# Altium schematic symbol library jlcpcb_2025_04_capacitors_extended_0402.schlib: 3594 symbols (part 12 of 20) (continued)
## FN15X562K250PNG
designator C?  Capacitance: 5.6nF  (hidden comment: *)
Capacitor, Ceramic (MLCC), 5.6nF, ±10%, 25V, X7R, ±10%, SMD 0402; Manufacturer: PSA(Prosperity Dielectrics); Manufacturer Part Number: FN15X562K250PNG; Package Size: 0402; JLCPCB Basic Part: No; JLCPCB Part Number: C565560; Supplier 1: LCSC; Category: Capacitors - MLCC; Supplier Part Number 1: C565560; Tolerance: ±10%; Voltage Rating: 25V; Temperature Coefficient: X7R; RoHS: Yes; ComponentLink1Description: Datasheet; ComponentLink2Description: JLCPCB Part URL; ComponentLink2URL: https://jlcpcb.com/partdetail/C565560; ComponentLink3Description: LCSC Part URL; ComponentLink3URL: https://lcsc.com/product-detail/Multilayer-Ceramic-Capacitors-MLCC---SMD-SMT_PSAProsperity-Dielectrics-PSAProsperity-Dielectrics-FN15X562K250PNG_C565560.html
footprint CAP-0402 (0402 (1005M) Capacitor)
pins: 1, 2

## FN15X562K500PNG
designator C?  Capacitance: 5.6nF  (hidden comment: *)
Capacitor, Ceramic (MLCC), 5.6nF, ±10%, 50V, X7R, ±10%, SMD 0402; Manufacturer: PSA(Prosperity Dielectrics); Manufacturer Part Number: FN15X562K500PNG; Package Size: 0402; JLCPCB Basic Part: No; JLCPCB Part Number: C363545; Supplier 1: LCSC; Category: Capacitors - MLCC; Supplier Part Number 1: C363545; Tolerance: ±10%; Voltage Rating: 50V; Temperature Coefficient: X7R; RoHS: Yes; ComponentLink1Description: Datasheet; ComponentLink1URL: https://wmsc.lcsc.com/wmsc/upload/file/pdf/v2/lcsc/2304140030_PSA-Prosperity-Dielectrics-FN15X562K500PNG_C363545.pdf; ComponentLink2Description: JLCPCB Part URL; ComponentLink2URL: https://jlcpcb.com/partdetail/C363545; ComponentLink3Description: LCSC Part URL; ComponentLink3URL: https://lcsc.com/product-detail/Multilayer-Ceramic-Capacitors-MLCC---SMD-SMT_PSAProsperity-Dielectrics-PSAProsperity-Dielectrics-FN15X562K500PNG_C363545.html
footprint CAP-0402 (0402 (1005M) Capacitor)
pins: 1, 2

## FN15X563K250PNG
designator C?  Capacitance: 56nF  (hidden comment: *)
Capacitor, Ceramic (MLCC), 56nF, ±10%, 25V, X7R, ±10%, SMD 0402; Manufacturer: PSA(Prosperity Dielectrics); Manufacturer Part Number: FN15X563K250PNG; Package Size: 0402; JLCPCB Basic Part: No; JLCPCB Part Number: C565561; Supplier 1: LCSC; Category: Capacitors - MLCC; Supplier Part Number 1: C565561; Tolerance: ±10%; Voltage Rating: 25V; Temperature Coefficient: X7R; RoHS: Yes; ComponentLink1Description: Datasheet; ComponentLink2Description: JLCPCB Part URL; ComponentLink2URL: https://jlcpcb.com/partdetail/C565561; ComponentLink3Description: LCSC Part URL; ComponentLink3URL: https://lcsc.com/product-detail/Multilayer-Ceramic-Capacitors-MLCC---SMD-SMT_PSAProsperity-Dielectrics-PSAProsperity-Dielectrics-FN15X563K250PNG_C565561.html
footprint CAP-0402 (0402 (1005M) Capacitor)
pins: 1, 2

## FN15X682K250PNG
designator C?  Capacitance: 6.8nF  (hidden comment: *)
Capacitor, Ceramic (MLCC), 6.8nF, ±10%, 25V, X7R, ±10%, SMD 0402; Manufacturer: PSA(Prosperity Dielectrics); Manufacturer Part Number: FN15X682K250PNG; Package Size: 0402; JLCPCB Basic Part: No; JLCPCB Part Number: C565472; Supplier 1: LCSC; Category: Capacitors - MLCC; Supplier Part Number 1: C565472; Tolerance: ±10%; Voltage Rating: 25V; Temperature Coefficient: X7R; RoHS: Yes; ComponentLink1Description: Datasheet; ComponentLink2Description: JLCPCB Part URL; ComponentLink2URL: https://jlcpcb.com/partdetail/C565472; ComponentLink3Description: LCSC Part URL; ComponentLink3URL: https://lcsc.com/product-detail/Multilayer-Ceramic-Capacitors-MLCC---SMD-SMT_PSAProsperity-Dielectrics-PSAProsperity-Dielectrics-FN15X682K250PNG_C565472.html
footprint CAP-0402 (0402 (1005M) Capacitor)
pins: 1, 2

## FN15X683K250PNG
designator C?  Capacitance: 68nF  (hidden comment: *)
Capacitor, Ceramic (MLCC), 68nF, ±10%, 25V, X7R, ±10%, SMD 0402; Manufacturer: PSA(Prosperity Dielectrics); Manufacturer Part Number: FN15X683K250PNG; Package Size: 0402; JLCPCB Basic Part: No; JLCPCB Part Number: C565562; Supplier 1: LCSC; Category: Capacitors - MLCC; Supplier Part Number 1: C565562; Tolerance: ±10%; Voltage Rating: 25V; Temperature Coefficient: X7R; RoHS: Yes; ComponentLink1Description: Datasheet; ComponentLink1URL: https://wmsc.lcsc.com/wmsc/upload/file/pdf/v2/lcsc/2304140030_PSA-Prosperity-Dielectrics-FN15X683K250PNG_C565562.pdf; ComponentLink2Description: JLCPCB Part URL; ComponentLink2URL: https://jlcpcb.com/partdetail/C565562; ComponentLink3Description: LCSC Part URL; ComponentLink3URL: https://lcsc.com/product-detail/Multilayer-Ceramic-Capacitors-MLCC---SMD-SMT_PSAProsperity-Dielectrics-PSAProsperity-Dielectrics-FN15X683K250PNG_C565562.html
footprint CAP-0402 (0402 (1005M) Capacitor)
pins: 1, 2

## FN15X821K250PNG
designator C?  Capacitance: 820pF  (hidden comment: *)
Capacitor, Ceramic (MLCC), 820pF, ±10%, 25V, X7R, ±10%, SMD 0402; Manufacturer: PSA(Prosperity Dielectrics); Manufacturer Part Number: FN15X821K250PNG; Package Size: 0402; JLCPCB Basic Part: No; JLCPCB Part Number: C565563; Supplier 1: LCSC; Category: Capacitors - MLCC; Supplier Part Number 1: C565563; Tolerance: ±10%; Voltage Rating: 25V; Temperature Coefficient: X7R; RoHS: Yes; ComponentLink1Description: Datasheet; ComponentLink1URL: https://wmsc.lcsc.com/wmsc/upload/file/pdf/v2/lcsc/2304140030_PSA-Prosperity-Dielectrics-FN15X821K250PNG_C565563.pdf; ComponentLink2Description: JLCPCB Part URL; ComponentLink2URL: https://jlcpcb.com/partdetail/C565563; ComponentLink3Description: LCSC Part URL; ComponentLink3URL: https://lcsc.com/product-detail/Multilayer-Ceramic-Capacitors-MLCC---SMD-SMT_PSAProsperity-Dielectrics-PSAProsperity-Dielectrics-FN15X821K250PNG_C565563.html
footprint CAP-0402 (0402 (1005M) Capacitor)
pins: 1, 2

## FN15X822K250PNG
designator C?  Capacitance: 8.2nF  (hidden comment: *)
Capacitor, Ceramic (MLCC), 8.2nF, ±10%, 25V, X7R, ±10%, SMD 0402; Manufacturer: PSA(Prosperity Dielectrics); Manufacturer Part Number: FN15X822K250PNG; Package Size: 0402; JLCPCB Basic Part: No; JLCPCB Part Number: C565564; Supplier 1: LCSC; Category: Capacitors - MLCC; Supplier Part Number 1: C565564; Tolerance: ±10%; Voltage Rating: 25V; Temperature Coefficient: X7R; RoHS: Yes; ComponentLink1Description: Datasheet; ComponentLink1URL: https://wmsc.lcsc.com/wmsc/upload/file/pdf/v2/lcsc/2304140030_PSA-Prosperity-Dielectrics-FN15X822K250PNG_C565564.pdf; ComponentLink2Description: JLCPCB Part URL; ComponentLink2URL: https://jlcpcb.com/partdetail/C565564; ComponentLink3Description: LCSC Part URL; ComponentLink3URL: https://lcsc.com/product-detail/Multilayer-Ceramic-Capacitors-MLCC---SMD-SMT_PSAProsperity-Dielectrics-PSAProsperity-Dielectrics-FN15X822K250PNG_C565564.html
footprint CAP-0402 (0402 (1005M) Capacitor)
pins: 1, 2

## FN15X823K160PNG
designator C?  Capacitance: 82nF  (hidden comment: *)
Capacitor, Ceramic (MLCC), 82nF, ±10%, 16V, X7R, ±10%, SMD 0402; Manufacturer: PSA(Prosperity Dielectrics); Manufacturer Part Number: FN15X823K160PNG; Package Size: 0402; JLCPCB Basic Part: No; JLCPCB Part Number: C525232; Supplier 1: LCSC; Category: Capacitors - MLCC; Supplier Part Number 1: C525232; Tolerance: ±10%; Voltage Rating: 16V; Temperature Coefficient: X7R; RoHS: Yes; ComponentLink1Description: Datasheet; ComponentLink1URL: https://wmsc.lcsc.com/wmsc/upload/file/pdf/v2/lcsc/2304140030_PSA-Prosperity-Dielectrics-FN15X823K160PNG_C525232.pdf; ComponentLink2Description: JLCPCB Part URL; ComponentLink2URL: https://jlcpcb.com/partdetail/C525232; ComponentLink3Description: LCSC Part URL; ComponentLink3URL: https://lcsc.com/product-detail/Multilayer-Ceramic-Capacitors-MLCC---SMD-SMT_PSAProsperity-Dielectrics-PSAProsperity-Dielectrics-FN15X823K160PNG_C525232.html
footprint CAP-0402 (0402 (1005M) Capacitor)
pins: 1, 2

## FS15B105K6R3PKG
designator C?  Capacitance: 1uF  (hidden comment: *)
Capacitor, Ceramic (MLCC), 1uF, ±10%, 6.3V, X5R, ±10%, SMD 0402; Manufacturer: PSA(Prosperity Dielectrics); Manufacturer Part Number: FS15B105K6R3PKG; Package Size: 0402; JLCPCB Basic Part: No; JLCPCB Part Number: C394161; Supplier 1: LCSC; Category: Capacitors - MLCC; Supplier Part Number 1: C394161; Tolerance: ±10%; Voltage Rating: 6.3V; Temperature Coefficient: X5R; RoHS: Yes; ComponentLink1Description: Datasheet; ComponentLink1URL: https://wmsc.lcsc.com/wmsc/upload/file/pdf/v2/lcsc/2304140030_PSA-Prosperity-Dielectrics-FS15B105K6R3PKG_C394161.pdf; ComponentLink2Description: JLCPCB Part URL; ComponentLink2URL: https://jlcpcb.com/partdetail/C394161; ComponentLink3Description: LCSC Part URL; ComponentLink3URL: https://lcsc.com/product-detail/Multilayer-Ceramic-Capacitors-MLCC---SMD-SMT_PSAProsperity-Dielectrics-PSAProsperity-Dielectrics-FS15B105K6R3PKG_C394161.html
footprint CAP-0402 (0402 (1005M) Capacitor)
pins: 1, 2

## FS15B105K6R3PNG
designator C?  Capacitance: 1uF  (hidden comment: *)
Capacitor, Ceramic (MLCC), 1uF, ±10%, 6.3V, X5R, ±10%, SMD 0402; Manufacturer: PSA(Prosperity Dielectrics); Manufacturer Part Number: FS15B105K6R3PNG; Package Size: 0402; JLCPCB Basic Part: No; JLCPCB Part Number: C525327; Supplier 1: LCSC; Category: Capacitors - MLCC; Supplier Part Number 1: C525327; Tolerance: ±10%; Voltage Rating: 6.3V; Temperature Coefficient: X5R; RoHS: Yes; ComponentLink1Description: Datasheet; ComponentLink1URL: https://wmsc.lcsc.com/wmsc/upload/file/pdf/v2/lcsc/2304140030_PSA-Prosperity-Dielectrics-FS15B105K6R3PNG_C525327.pdf; ComponentLink2Description: JLCPCB Part URL; ComponentLink2URL: https://jlcpcb.com/partdetail/C525327; ComponentLink3Description: LCSC Part URL; ComponentLink3URL: https://lcsc.com/product-detail/Multilayer-Ceramic-Capacitors-MLCC---SMD-SMT_PSAProsperity-Dielectrics-PSAProsperity-Dielectrics-FS15B105K6R3PNG_C525327.html
footprint CAP-0402 (0402 (1005M) Capacitor)
pins: 1, 2

## FS15B105K100PKG
designator C?  Capacitance: 1uF  (hidden comment: *)
Capacitor, Ceramic (MLCC), 1uF, ±10%, 10V, X5R, ±10%, SMD 0402; Manufacturer: PSA(Prosperity Dielectrics); Manufacturer Part Number: FS15B105K100PKG; Package Size: 0402; JLCPCB Basic Part: No; JLCPCB Part Number: C525324; Supplier 1: LCSC; Category: Capacitors - MLCC; Supplier Part Number 1: C525324; Tolerance: ±10%; Voltage Rating: 10V; Temperature Coefficient: X5R; RoHS: Yes; ComponentLink1Description: Datasheet; ComponentLink1URL: https://wmsc.lcsc.com/wmsc/upload/file/pdf/v2/lcsc/2304140030_PSA-Prosperity-Dielectrics-FS15B105K100PKG_C525324.pdf; ComponentLink2Description: JLCPCB Part URL; ComponentLink2URL: https://jlcpcb.com/partdetail/C525324; ComponentLink3Description: LCSC Part URL; ComponentLink3URL: https://lcsc.com/product-detail/Multilayer-Ceramic-Capacitors-MLCC---SMD-SMT_PSAProsperity-Dielectrics-PSAProsperity-Dielectrics-FS15B105K100PKG_C525324.html
footprint CAP-0402 (0402 (1005M) Capacitor)
pins: 1, 2

## FS15B105K160PKG
designator C?  Capacitance: 1uF  (hidden comment: *)
Capacitor, Ceramic (MLCC), 1uF, ±10%, 16V, X5R, ±10%, SMD 0402; Manufacturer: PSA(Prosperity Dielectrics); Manufacturer Part Number: FS15B105K160PKG; Package Size: 0402; JLCPCB Basic Part: No; JLCPCB Part Number: C363524; Supplier 1: LCSC; Category: Capacitors - MLCC; Supplier Part Number 1: C363524; Tolerance: ±10%; Voltage Rating: 16V; Temperature Coefficient: X5R; RoHS: Yes; ComponentLink1Description: Datasheet; ComponentLink1URL: https://wmsc.lcsc.com/wmsc/upload/file/pdf/v2/lcsc/2304140030_PSA-Prosperity-Dielectrics-FS15B105K160PKG_C363524.pdf; ComponentLink2Description: JLCPCB Part URL; ComponentLink2URL: https://jlcpcb.com/partdetail/C363524; ComponentLink3Description: LCSC Part URL; ComponentLink3URL: https://lcsc.com/product-detail/Multilayer-Ceramic-Capacitors-MLCC---SMD-SMT_PSAProsperity-Dielectrics-PSAProsperity-Dielectrics-FS15B105K160PKG_C363524.html
footprint CAP-0402 (0402 (1005M) Capacitor)
pins: 1, 2

## FS15B105K160PNG
designator C?  Capacitance: 1uF  (hidden comment: *)
Capacitor, Ceramic (MLCC), 1uF, ±10%, 16V, X5R, ±10%, SMD 0402; Manufacturer: PSA(Prosperity Dielectrics); Manufacturer Part Number: FS15B105K160PNG; Package Size: 0402; JLCPCB Basic Part: No; JLCPCB Part Number: C525325; Supplier 1: LCSC; Category: Capacitors - MLCC; Supplier Part Number 1: C525325; Tolerance: ±10%; Voltage Rating: 16V; Temperature Coefficient: X5R; RoHS: Yes; ComponentLink1Description: Datasheet; ComponentLink1URL: https://wmsc.lcsc.com/wmsc/upload/file/pdf/v2/lcsc/2304140030_PSA-Prosperity-Dielectrics-FS15B105K160PNG_C525325.pdf; ComponentLink2Description: JLCPCB Part URL; ComponentLink2URL: https://jlcpcb.com/partdetail/C525325; ComponentLink3Description: LCSC Part URL; ComponentLink3URL: https://lcsc.com/product-detail/Multilayer-Ceramic-Capacitors-MLCC---SMD-SMT_PSAProsperity-Dielectrics-PSAProsperity-Dielectrics-FS15B105K160PNG_C525325.html
footprint CAP-0402 (0402 (1005M) Capacitor)
pins: 1, 2

## FS15B106M6R3PKG
designator C?  Capacitance: 10uF  (hidden comment: *)
Capacitor, Ceramic (MLCC), 10uF, ±20%, 6.3V, X5R, ±20%, SMD 0402; Manufacturer: PSA(Prosperity Dielectrics); Manufacturer Part Number: FS15B106M6R3PKG; Package Size: 0402; JLCPCB Basic Part: No; JLCPCB Part Number: C525328; Supplier 1: LCSC; Category: Capacitors - MLCC; Supplier Part Number 1: C525328; Tolerance: ±20%; Voltage Rating: 6.3V; Temperature Coefficient: X5R; RoHS: Yes; ComponentLink1Description: Datasheet; ComponentLink1URL: https://wmsc.lcsc.com/wmsc/upload/file/pdf/v2/lcsc/2304140030_PSA-Prosperity-Dielectrics-FS15B106M6R3PKG_C525328.pdf; ComponentLink2Description: JLCPCB Part URL; ComponentLink2URL: https://jlcpcb.com/partdetail/C525328; ComponentLink3Description: LCSC Part URL; ComponentLink3URL: https://lcsc.com/product-detail/Multilayer-Ceramic-Capacitors-MLCC---SMD-SMT_PSAProsperity-Dielectrics-PSAProsperity-Dielectrics-FS15B106M6R3PKG_C525328.html
footprint CAP-0402 (0402 (1005M) Capacitor)
pins: 1, 2

## FS15B225M160PKG
designator C?  Capacitance: 2.2uF  (hidden comment: *)
Capacitor, Ceramic (MLCC), 2.2uF, ±20%, 16V, X5R, ±20%, SMD 0402; Manufacturer: PSA(Prosperity Dielectrics); Manufacturer Part Number: FS15B225M160PKG; Package Size: 0402; JLCPCB Basic Part: No; JLCPCB Part Number: C363526; Supplier 1: LCSC; Category: Capacitors - MLCC; Supplier Part Number 1: C363526; Tolerance: ±20%; Voltage Rating: 16V; Temperature Coefficient: X5R; RoHS: Yes; ComponentLink1Description: Datasheet; ComponentLink1URL: https://wmsc.lcsc.com/wmsc/upload/file/pdf/v2/lcsc/2304140030_PSA-Prosperity-Dielectrics-FS15B225M160PKG_C363526.pdf; ComponentLink2Description: JLCPCB Part URL; ComponentLink2URL: https://jlcpcb.com/partdetail/C363526; ComponentLink3Description: LCSC Part URL; ComponentLink3URL: https://lcsc.com/product-detail/Multilayer-Ceramic-Capacitors-MLCC---SMD-SMT_PSAProsperity-Dielectrics-PSAProsperity-Dielectrics-FS15B225M160PKG_C363526.html
footprint CAP-0402 (0402 (1005M) Capacitor)
pins: 1, 2

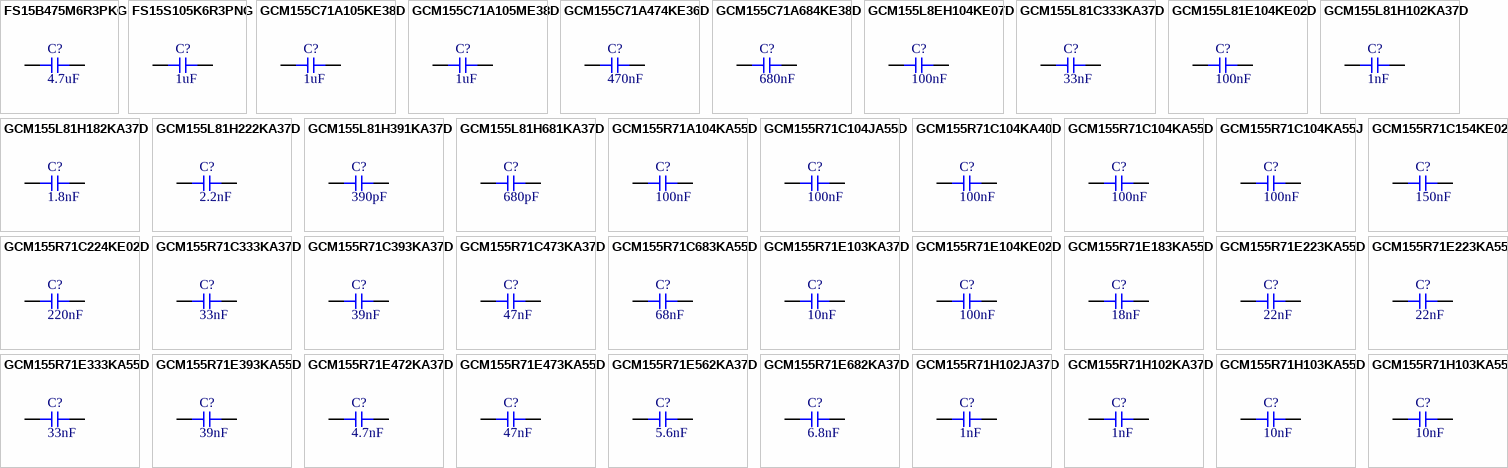
[diagram p55: symbols FS15B475M6R3PKG to GCM155R71H103KA55J]

## FS15B475M6R3PKG
designator C?  Capacitance: 4.7uF  (hidden comment: *)
Capacitor, Ceramic (MLCC), 4.7uF, ±20%, 6.3V, X5R, ±20%, SMD 0402; Manufacturer: PSA(Prosperity Dielectrics); Manufacturer Part Number: FS15B475M6R3PKG; Package Size: 0402; JLCPCB Basic Part: No; JLCPCB Part Number: C2874744; Supplier 1: LCSC; Category: Capacitors - MLCC; Supplier Part Number 1: C2874744; Tolerance: ±20%; Voltage Rating: 6.3V; Temperature Coefficient: X5R; RoHS: Yes; ComponentLink1Description: Datasheet; ComponentLink1URL: https://wmsc.lcsc.com/wmsc/upload/file/pdf/v2/lcsc/2108150330_PSA-Prosperity-Dielectrics-FS15B475M6R3PKG_C2874744.pdf; ComponentLink2Description: JLCPCB Part URL; ComponentLink2URL: https://jlcpcb.com/partdetail/C2874744; ComponentLink3Description: LCSC Part URL; ComponentLink3URL: https://lcsc.com/product-detail/Multilayer-Ceramic-Capacitors-MLCC---SMD-SMT_PSAProsperity-Dielectrics-PSAProsperity-Dielectrics-FS15B475M6R3PKG_C2874744.html
footprint CAP-0402 (0402 (1005M) Capacitor)
pins: 1, 2

## FS15S105K6R3PNG
designator C?  Capacitance: 1uF  (hidden comment: *)
Capacitor, Ceramic (MLCC), 1uF, 6.3V, X6S, SMD 0402; Manufacturer: PSA(Prosperity Dielectrics); Manufacturer Part Number: FS15S105K6R3PNG; Package Size: 0402; JLCPCB Basic Part: No; JLCPCB Part Number: C2929193; Supplier 1: LCSC; Category: Capacitors - MLCC; Supplier Part Number 1: C2929193; Voltage Rating: 6.3V; Temperature Coefficient: X6S; RoHS: Yes; ComponentLink1Description: Datasheet; ComponentLink1URL: https://wmsc.lcsc.com/wmsc/upload/file/pdf/v2/lcsc/2201121400_PSA-Prosperity-Dielectrics-FS15S105K6R3PNG_C2929193.pdf; ComponentLink2Description: JLCPCB Part URL; ComponentLink2URL: https://jlcpcb.com/partdetail/C2929193; ComponentLink3Description: LCSC Part URL; ComponentLink3URL: https://lcsc.com/product-detail/Multilayer-Ceramic-Capacitors-MLCC---SMD-SMT_PSAProsperity-Dielectrics-PSAProsperity-Dielectrics-FS15S105K6R3PNG_C2929193.html
footprint CAP-0402 (0402 (1005M) Capacitor)
pins: 1, 2

## GCM155C71A105KE38D
designator C?  Capacitance: 1uF  (hidden comment: *)
Capacitor, Ceramic (MLCC), 1uF, ±10%, 10V, X7S, ±10%, SMD 0402; Manufacturer: Murata Electronics; Manufacturer Part Number: GCM155C71A105KE38D; Package Size: 0402; JLCPCB Basic Part: No; JLCPCB Part Number: C126521; Supplier 1: LCSC; Category: Capacitors - MLCC; Supplier Part Number 1: C126521; Tolerance: ±10%; Voltage Rating: 10V; Temperature Coefficient: X7S; RoHS: Yes; ComponentLink1Description: Datasheet; ComponentLink1URL: https://wmsc.lcsc.com/wmsc/upload/file/pdf/v2/lcsc/1912111437_Murata-Electronics-GCM155C71A105KE38D_C126521.pdf; ComponentLink2Description: JLCPCB Part URL; ComponentLink2URL: https://jlcpcb.com/partdetail/C126521; ComponentLink3Description: LCSC Part URL; ComponentLink3URL: https://lcsc.com/product-detail/Multilayer-Ceramic-Capacitors-MLCC---SMD-SMT_Murata-Electronics-Murata-Electronics-GCM155C71A105KE38D_C126521.html
footprint CAP-0402 (0402 (1005M) Capacitor)
pins: 1, 2

## GCM155C71A105ME38D
designator C?  Capacitance: 1uF  (hidden comment: *)
Capacitor, Ceramic (MLCC), 1uF, ±20%, 10V, X7S, ±20%, SMD 0402; Manufacturer: Murata Electronics; Manufacturer Part Number: GCM155C71A105ME38D; Package Size: 0402; JLCPCB Basic Part: No; JLCPCB Part Number: C710660; Supplier 1: LCSC; Category: Capacitors - MLCC; Supplier Part Number 1: C710660; Tolerance: ±20%; Voltage Rating: 10V; Temperature Coefficient: X7S; RoHS: Yes; ComponentLink1Description: Datasheet; ComponentLink1URL: https://wmsc.lcsc.com/wmsc/upload/file/pdf/v2/lcsc/2210190600_Murata-Electronics-GCM155C71A105ME38D_C710660.pdf; ComponentLink2Description: JLCPCB Part URL; ComponentLink2URL: https://jlcpcb.com/partdetail/C710660; ComponentLink3Description: LCSC Part URL; ComponentLink3URL: https://lcsc.com/product-detail/Multilayer-Ceramic-Capacitors-MLCC---SMD-SMT_Murata-Electronics-Murata-Electronics-GCM155C71A105ME38D_C710660.html
footprint CAP-0402 (0402 (1005M) Capacitor)
pins: 1, 2

## GCM155C71A474KE36D
designator C?  Capacitance: 470nF  (hidden comment: *)
Capacitor, Ceramic (MLCC), 470nF, ±10%, 10V, X7S, ±10%, SMD 0402; Manufacturer: Murata Electronics; Manufacturer Part Number: GCM155C71A474KE36D; Package Size: 0402; JLCPCB Basic Part: No; JLCPCB Part Number: C126522; Supplier 1: LCSC; Category: Capacitors - MLCC; Supplier Part Number 1: C126522; Tolerance: ±10%; Voltage Rating: 10V; Temperature Coefficient: X7S; RoHS: Yes; ComponentLink1Description: Datasheet; ComponentLink1URL: https://wmsc.lcsc.com/wmsc/upload/file/pdf/v2/lcsc/1912111437_Murata-Electronics-GCM155C71A474KE36D_C126522.pdf; ComponentLink2Description: JLCPCB Part URL; ComponentLink2URL: https://jlcpcb.com/partdetail/C126522; ComponentLink3Description: LCSC Part URL; ComponentLink3URL: https://lcsc.com/product-detail/Multilayer-Ceramic-Capacitors-MLCC---SMD-SMT_Murata-Electronics-Murata-Electronics-GCM155C71A474KE36D_C126522.html
footprint CAP-0402 (0402 (1005M) Capacitor)
pins: 1, 2

## GCM155C71A684KE38D
designator C?  Capacitance: 680nF  (hidden comment: *)
Capacitor, Ceramic (MLCC), 680nF, ±10%, 10V, X7S, ±10%, SMD 0402; Manufacturer: Murata Electronics; Manufacturer Part Number: GCM155C71A684KE38D; Package Size: 0402; JLCPCB Basic Part: No; JLCPCB Part Number: C710661; Supplier 1: LCSC; Category: Capacitors - MLCC; Supplier Part Number 1: C710661; Tolerance: ±10%; Voltage Rating: 10V; Temperature Coefficient: X7S; RoHS: Yes; ComponentLink1Description: Datasheet; ComponentLink1URL: https://wmsc.lcsc.com/wmsc/upload/file/pdf/v2/lcsc/2101081033_Murata-Electronics-GCM155C71A684KE38D_C710661.pdf; ComponentLink2Description: JLCPCB Part URL; ComponentLink2URL: https://jlcpcb.com/partdetail/C710661; ComponentLink3Description: LCSC Part URL; ComponentLink3URL: https://lcsc.com/product-detail/Multilayer-Ceramic-Capacitors-MLCC---SMD-SMT_Murata-Electronics-Murata-Electronics-GCM155C71A684KE38D_C710661.html
footprint CAP-0402 (0402 (1005M) Capacitor)
pins: 1, 2

## GCM155L8EH104KE07D
designator C?  Capacitance: 100nF  (hidden comment: *)
Capacitor, Ceramic (MLCC), 100nF, ±10%, 50V, X8L, ±10%, SMD 0402; Manufacturer: Murata Electronics; Manufacturer Part Number: GCM155L8EH104KE07D; Package Size: 0402; JLCPCB Basic Part: No; JLCPCB Part Number: C710662; Supplier 1: LCSC; Category: Capacitors - MLCC; Supplier Part Number 1: C710662; Tolerance: ±10%; Voltage Rating: 50V; Temperature Coefficient: X8L; RoHS: Yes; ComponentLink1Description: Datasheet; ComponentLink1URL: https://wmsc.lcsc.com/wmsc/upload/file/pdf/v2/lcsc/2210190600_Murata-Electronics-GCM155L8EH104KE07D_C710662.pdf; ComponentLink2Description: JLCPCB Part URL; ComponentLink2URL: https://jlcpcb.com/partdetail/C710662; ComponentLink3Description: LCSC Part URL; ComponentLink3URL: https://lcsc.com/product-detail/Multilayer-Ceramic-Capacitors-MLCC---SMD-SMT_Murata-Electronics-Murata-Electronics-GCM155L8EH104KE07D_C710662.html
footprint CAP-0402 (0402 (1005M) Capacitor)
pins: 1, 2

## GCM155L81C333KA37D
designator C?  Capacitance: 33nF  (hidden comment: *)
Capacitor, Ceramic (MLCC), 33nF, ±10%, ±10%, SMD 0402; Manufacturer: Murata Electronics; Manufacturer Part Number: GCM155L81C333KA37D; Package Size: 0402; JLCPCB Basic Part: No; JLCPCB Part Number: C907734; Supplier 1: LCSC; Category: Capacitors - MLCC; Supplier Part Number 1: C907734; Tolerance: ±10%; RoHS: Yes; ComponentLink1Description: Datasheet; ComponentLink1URL: https://wmsc.lcsc.com/wmsc/upload/file/pdf/v2/lcsc/2201242100_Murata-Electronics-GCM155L81C333KA37D_C907734.pdf; ComponentLink2Description: JLCPCB Part URL; ComponentLink2URL: https://jlcpcb.com/partdetail/C907734; ComponentLink3Description: LCSC Part URL; ComponentLink3URL: https://lcsc.com/product-detail/Multilayer-Ceramic-Capacitors-MLCC---SMD-SMT_Murata-Electronics-Murata-Electronics-GCM155L81C333KA37D_C907734.html
footprint CAP-0402 (0402 (1005M) Capacitor)
pins: 1, 2

## GCM155L81E104KE02D
designator C?  Capacitance: 100nF  (hidden comment: *)
Capacitor, Ceramic (MLCC), 100nF, ±10%, 25V, ±10%, SMD 0402; Manufacturer: Murata Electronics; Manufacturer Part Number: GCM155L81E104KE02D; Package Size: 0402; JLCPCB Basic Part: No; JLCPCB Part Number: C2180807; Supplier 1: LCSC; Category: Capacitors - MLCC; Supplier Part Number 1: C2180807; Tolerance: ±10%; Voltage Rating: 25V; RoHS: Yes; ComponentLink1Description: Datasheet; ComponentLink1URL: https://wmsc.lcsc.com/wmsc/upload/file/pdf/v2/lcsc/2108052130_Murata-Electronics-GCM155L81E104KE02D_C2180807.pdf; ComponentLink2Description: JLCPCB Part URL; ComponentLink2URL: https://jlcpcb.com/partdetail/C2180807; ComponentLink3Description: LCSC Part URL; ComponentLink3URL: https://lcsc.com/product-detail/Multilayer-Ceramic-Capacitors-MLCC---SMD-SMT_Murata-Electronics-Murata-Electronics-GCM155L81E104KE02D_C2180807.html
footprint CAP-0402 (0402 (1005M) Capacitor)
pins: 1, 2

## GCM155L81H102KA37D
designator C?  Capacitance: 1nF  (hidden comment: *)
Capacitor, Ceramic (MLCC), 1nF, ±10%, null, ±10%, SMD 0402; Manufacturer: Murata Electronics; Manufacturer Part Number: GCM155L81H102KA37D; Package Size: 0402; JLCPCB Basic Part: No; JLCPCB Part Number: C701290; Supplier 1: LCSC; Category: Capacitors - MLCC; Supplier Part Number 1: C701290; Tolerance: ±10%; Voltage Rating: null; RoHS: Yes; ComponentLink1Description: Datasheet; ComponentLink1URL: https://wmsc.lcsc.com/wmsc/upload/file/pdf/v2/lcsc/2304140030_Murata-Electronics-GCM155L81H102KA37D_C701290.pdf; ComponentLink2Description: JLCPCB Part URL; ComponentLink2URL: https://jlcpcb.com/partdetail/C701290; ComponentLink3Description: LCSC Part URL; ComponentLink3URL: https://lcsc.com/product-detail/Multilayer-Ceramic-Capacitors-MLCC---SMD-SMT_Murata-Electronics-Murata-Electronics-GCM155L81H102KA37D_C701290.html
footprint CAP-0402 (0402 (1005M) Capacitor)
pins: 1, 2

## GCM155L81H182KA37D
designator C?  Capacitance: 1.8nF  (hidden comment: *)
Capacitor, Ceramic (MLCC), 1.8nF, ±10%, ±10%, SMD 0402; Manufacturer: Murata Electronics; Manufacturer Part Number: GCM155L81H182KA37D; Package Size: 0402; JLCPCB Basic Part: No; JLCPCB Part Number: C913465; Supplier 1: LCSC; Category: Capacitors - MLCC; Supplier Part Number 1: C913465; Tolerance: ±10%; RoHS: Yes; ComponentLink1Description: Datasheet; ComponentLink1URL: https://wmsc.lcsc.com/wmsc/upload/file/pdf/v2/lcsc/2201131300_Murata-Electronics-GCM155L81H182KA37D_C913465.pdf; ComponentLink2Description: JLCPCB Part URL; ComponentLink2URL: https://jlcpcb.com/partdetail/C913465; ComponentLink3Description: LCSC Part URL; ComponentLink3URL: https://lcsc.com/product-detail/Multilayer-Ceramic-Capacitors-MLCC---SMD-SMT_Murata-Electronics-Murata-Electronics-GCM155L81H182KA37D_C913465.html
footprint CAP-0402 (0402 (1005M) Capacitor)
pins: 1, 2

## GCM155L81H222KA37D
designator C?  Capacitance: 2.2nF  (hidden comment: *)
Capacitor, Ceramic (MLCC), 2.2nF, ±10%, ±10%, SMD 0402; Manufacturer: Murata Electronics; Manufacturer Part Number: GCM155L81H222KA37D; Package Size: 0402; JLCPCB Basic Part: No; JLCPCB Part Number: C782038; Supplier 1: LCSC; Category: Capacitors - MLCC; Supplier Part Number 1: C782038; Tolerance: ±10%; RoHS: Yes; ComponentLink1Description: Datasheet; ComponentLink1URL: https://wmsc.lcsc.com/wmsc/upload/file/pdf/v2/lcsc/2009161209_Murata-Electronics-GCM155L81H222KA37D_C782038.pdf; ComponentLink2Description: JLCPCB Part URL; ComponentLink2URL: https://jlcpcb.com/partdetail/C782038; ComponentLink3Description: LCSC Part URL; ComponentLink3URL: https://lcsc.com/product-detail/Multilayer-Ceramic-Capacitors-MLCC---SMD-SMT_Murata-Electronics-Murata-Electronics-GCM155L81H222KA37D_C782038.html
footprint CAP-0402 (0402 (1005M) Capacitor)
pins: 1, 2

## GCM155L81H391KA37D
designator C?  Capacitance: 390pF  (hidden comment: *)
Capacitor, Ceramic (MLCC), 390pF, ±10%, ±10%, SMD 0402; Manufacturer: Murata Electronics; Manufacturer Part Number: GCM155L81H391KA37D; Package Size: 0402; JLCPCB Basic Part: No; JLCPCB Part Number: C907736; Supplier 1: LCSC; Category: Capacitors - MLCC; Supplier Part Number 1: C907736; Tolerance: ±10%; RoHS: Yes; ComponentLink1Description: Datasheet; ComponentLink1URL: https://wmsc.lcsc.com/wmsc/upload/file/pdf/v2/lcsc/2201242100_Murata-Electronics-GCM155L81H391KA37D_C907736.pdf; ComponentLink2Description: JLCPCB Part URL; ComponentLink2URL: https://jlcpcb.com/partdetail/C907736; ComponentLink3Description: LCSC Part URL; ComponentLink3URL: https://lcsc.com/product-detail/Multilayer-Ceramic-Capacitors-MLCC---SMD-SMT_Murata-Electronics-Murata-Electronics-GCM155L81H391KA37D_C907736.html
footprint CAP-0402 (0402 (1005M) Capacitor)
pins: 1, 2

## GCM155L81H681KA37D
designator C?  Capacitance: 680pF  (hidden comment: *)
Capacitor, Ceramic (MLCC), 680pF, ±10%, 50V, X8L, ±10%, SMD 0402; Manufacturer: Murata Electronics; Manufacturer Part Number: GCM155L81H681KA37D; Package Size: 0402; JLCPCB Basic Part: No; JLCPCB Part Number: C907735; Supplier 1: LCSC; Category: Capacitors - MLCC; Supplier Part Number 1: C907735; Tolerance: ±10%; Voltage Rating: 50V; Temperature Coefficient: X8L; RoHS: Yes; ComponentLink1Description: Datasheet; ComponentLink1URL: https://wmsc.lcsc.com/wmsc/upload/file/pdf/v2/lcsc/2201242100_Murata-Electronics-GCM155L81H681KA37D_C907735.pdf; ComponentLink2Description: JLCPCB Part URL; ComponentLink2URL: https://jlcpcb.com/partdetail/C907735; ComponentLink3Description: LCSC Part URL; ComponentLink3URL: https://lcsc.com/product-detail/Multilayer-Ceramic-Capacitors-MLCC---SMD-SMT_Murata-Electronics-Murata-Electronics-GCM155L81H681KA37D_C907735.html
footprint CAP-0402 (0402 (1005M) Capacitor)
pins: 1, 2

## GCM155R71A104KA55D
designator C?  Capacitance: 100nF  (hidden comment: *)
Capacitor, Ceramic (MLCC), 100nF, ±10%, 10V, X7R, ±10%, SMD 0402; Manufacturer: Murata Electronics; Manufacturer Part Number: GCM155R71A104KA55D; Package Size: 0402; JLCPCB Basic Part: No; JLCPCB Part Number: C161163; Supplier 1: LCSC; Category: Capacitors - MLCC; Supplier Part Number 1: C161163; Tolerance: ±10%; Voltage Rating: 10V; Temperature Coefficient: X7R; RoHS: Yes; ComponentLink1Description: Datasheet; ComponentLink1URL: https://wmsc.lcsc.com/wmsc/upload/file/pdf/v2/lcsc/1811081550_Murata-Electronics-GCM155R71A104KA55D_C161163.pdf; ComponentLink2Description: JLCPCB Part URL; ComponentLink2URL: https://jlcpcb.com/partdetail/C161163; ComponentLink3Description: LCSC Part URL; ComponentLink3URL: https://lcsc.com/product-detail/Multilayer-Ceramic-Capacitors-MLCC---SMD-SMT_Murata-Electronics-Murata-Electronics-GCM155R71A104KA55D_C161163.html
footprint CAP-0402 (0402 (1005M) Capacitor)
pins: 1, 2

## GCM155R71C104JA55D
designator C?  Capacitance: 100nF  (hidden comment: *)
Capacitor, Ceramic (MLCC), 100nF, ±5%, 16V, ±5%, SMD 0402; Manufacturer: Murata Electronics; Manufacturer Part Number: GCM155R71C104JA55D; Package Size: 0402; JLCPCB Basic Part: No; JLCPCB Part Number: C2181836; Supplier 1: LCSC; Category: Capacitors - MLCC; Supplier Part Number 1: C2181836; Tolerance: ±5%; Voltage Rating: 16V; RoHS: Yes; ComponentLink1Description: Datasheet; ComponentLink1URL: https://wmsc.lcsc.com/wmsc/upload/file/pdf/v2/lcsc/2202041230_Murata-Electronics-GCM155R71C104JA55D_C2181836.pdf; ComponentLink2Description: JLCPCB Part URL; ComponentLink2URL: https://jlcpcb.com/partdetail/C2181836; ComponentLink3Description: LCSC Part URL; ComponentLink3URL: https://lcsc.com/product-detail/Multilayer-Ceramic-Capacitors-MLCC---SMD-SMT_Murata-Electronics-Murata-Electronics-GCM155R71C104JA55D_C2181836.html
footprint CAP-0402 (0402 (1005M) Capacitor)
pins: 1, 2

## GCM155R71C104KA40D
designator C?  Capacitance: 100nF  (hidden comment: *)
Capacitor, Ceramic (MLCC), 100nF, ±10%, 16V, X7R, ±10%, SMD 0402; Manufacturer: Murata Electronics; Manufacturer Part Number: GCM155R71C104KA40D; Package Size: 0402; JLCPCB Basic Part: No; JLCPCB Part Number: C126523; Supplier 1: LCSC; Category: Capacitors - MLCC; Supplier Part Number 1: C126523; Tolerance: ±10%; Voltage Rating: 16V; Temperature Coefficient: X7R; RoHS: Yes; ComponentLink1Description: Datasheet; ComponentLink2Description: JLCPCB Part URL; ComponentLink2URL: https://jlcpcb.com/partdetail/C126523; ComponentLink3Description: LCSC Part URL; ComponentLink3URL: https://lcsc.com/product-detail/Multilayer-Ceramic-Capacitors-MLCC---SMD-SMT_Murata-Electronics-Murata-Electronics-GCM155R71C104KA40D_C126523.html
footprint CAP-0402 (0402 (1005M) Capacitor)
pins: 1, 2

## GCM155R71C104KA55D
designator C?  Capacitance: 100nF  (hidden comment: *)
Capacitor, Ceramic (MLCC), 100nF, ±10%, 16V, X7R, ±10%, SMD 0402; Manufacturer: Murata Electronics; Manufacturer Part Number: GCM155R71C104KA55D; Package Size: 0402; JLCPCB Basic Part: No; JLCPCB Part Number: C85857; Supplier 1: LCSC; Category: Capacitors - MLCC; Supplier Part Number 1: C85857; Tolerance: ±10%; Voltage Rating: 16V; Temperature Coefficient: X7R; RoHS: Yes; ComponentLink1Description: Datasheet; ComponentLink1URL: https://wmsc.lcsc.com/wmsc/upload/file/pdf/v2/lcsc/2304140030_Murata-Electronics-GCM155R71C104KA55D_C85857.pdf; ComponentLink2Description: JLCPCB Part URL; ComponentLink2URL: https://jlcpcb.com/partdetail/C85857; ComponentLink3Description: LCSC Part URL; ComponentLink3URL: https://lcsc.com/product-detail/Multilayer-Ceramic-Capacitors-MLCC---SMD-SMT_Murata-Electronics-Murata-Electronics-GCM155R71C104KA55D_C85857.html
footprint CAP-0402 (0402 (1005M) Capacitor)
pins: 1, 2

## GCM155R71C104KA55J
designator C?  Capacitance: 100nF  (hidden comment: *)
Capacitor, Ceramic (MLCC), 100nF, ±10%, 16V, ±10%, SMD 0402; Manufacturer: Murata Electronics; Manufacturer Part Number: GCM155R71C104KA55J; Package Size: 0402; JLCPCB Basic Part: No; JLCPCB Part Number: C2655418; Supplier 1: LCSC; Category: Capacitors - MLCC; Supplier Part Number 1: C2655418; Tolerance: ±10%; Voltage Rating: 16V; RoHS: Yes; ComponentLink1Description: Datasheet; ComponentLink1URL: https://wmsc.lcsc.com/wmsc/upload/file/pdf/v2/lcsc/2108070730_Murata-Electronics-GCM155R71C104KA55J_C2655418.pdf; ComponentLink2Description: JLCPCB Part URL; ComponentLink2URL: https://jlcpcb.com/partdetail/C2655418; ComponentLink3Description: LCSC Part URL; ComponentLink3URL: https://lcsc.com/product-detail/Multilayer-Ceramic-Capacitors-MLCC---SMD-SMT_Murata-Electronics-Murata-Electronics-GCM155R71C104KA55J_C2655418.html
footprint CAP-0402 (0402 (1005M) Capacitor)
pins: 1, 2

## GCM155R71C154KE02D
designator C?  Capacitance: 150nF  (hidden comment: *)
Capacitor, Ceramic (MLCC), 150nF, ±10%, 16V, X7R, ±10%, SMD 0402; Manufacturer: Murata Electronics; Manufacturer Part Number: GCM155R71C154KE02D; Package Size: 0402; JLCPCB Basic Part: No; JLCPCB Part Number: C161164; Supplier 1: LCSC; Category: Capacitors - MLCC; Supplier Part Number 1: C161164; Tolerance: ±10%; Voltage Rating: 16V; Temperature Coefficient: X7R; RoHS: Yes; ComponentLink1Description: Datasheet; ComponentLink1URL: https://wmsc.lcsc.com/wmsc/upload/file/pdf/v2/lcsc/1811081550_Murata-Electronics-GCM155R71C154KE02D_C161164.pdf; ComponentLink2Description: JLCPCB Part URL; ComponentLink2URL: https://jlcpcb.com/partdetail/C161164; ComponentLink3Description: LCSC Part URL; ComponentLink3URL: https://lcsc.com/product-detail/Multilayer-Ceramic-Capacitors-MLCC---SMD-SMT_Murata-Electronics-Murata-Electronics-GCM155R71C154KE02D_C161164.html
footprint CAP-0402 (0402 (1005M) Capacitor)
pins: 1, 2

## GCM155R71C224KE02D
designator C?  Capacitance: 220nF  (hidden comment: *)
Capacitor, Ceramic (MLCC), 220nF, ±10%, 16V, X7R, ±10%, SMD 0402; Manufacturer: Murata Electronics; Manufacturer Part Number: GCM155R71C224KE02D; Package Size: 0402; JLCPCB Basic Part: No; JLCPCB Part Number: C126524; Supplier 1: LCSC; Category: Capacitors - MLCC; Supplier Part Number 1: C126524; Tolerance: ±10%; Voltage Rating: 16V; Temperature Coefficient: X7R; RoHS: Yes; ComponentLink1Description: Datasheet; ComponentLink1URL: https://wmsc.lcsc.com/wmsc/upload/file/pdf/v2/lcsc/1811081512_Murata-Electronics-GCM155R71C224KE02D_C126524.pdf; ComponentLink2Description: JLCPCB Part URL; ComponentLink2URL: https://jlcpcb.com/partdetail/C126524; ComponentLink3Description: LCSC Part URL; ComponentLink3URL: https://lcsc.com/product-detail/Multilayer-Ceramic-Capacitors-MLCC---SMD-SMT_Murata-Electronics-Murata-Electronics-GCM155R71C224KE02D_C126524.html
footprint CAP-0402 (0402 (1005M) Capacitor)
pins: 1, 2

## GCM155R71C333KA37D
designator C?  Capacitance: 33nF  (hidden comment: *)
Capacitor, Ceramic (MLCC), 33nF, ±10%, 16V, X7R, ±10%, SMD 0402; Manufacturer: Murata Electronics; Manufacturer Part Number: GCM155R71C333KA37D; Package Size: 0402; JLCPCB Basic Part: No; JLCPCB Part Number: C723886; Supplier 1: LCSC; Category: Capacitors - MLCC; Supplier Part Number 1: C723886; Tolerance: ±10%; Voltage Rating: 16V; Temperature Coefficient: X7R; RoHS: Yes; ComponentLink1Description: Datasheet; ComponentLink1URL: https://wmsc.lcsc.com/wmsc/upload/file/pdf/v2/lcsc/2008241234_Murata-Electronics-GCM155R71C333KA37D_C723886.pdf; ComponentLink2Description: JLCPCB Part URL; ComponentLink2URL: https://jlcpcb.com/partdetail/C723886; ComponentLink3Description: LCSC Part URL; ComponentLink3URL: https://lcsc.com/product-detail/Multilayer-Ceramic-Capacitors-MLCC---SMD-SMT_Murata-Electronics-Murata-Electronics-GCM155R71C333KA37D_C723886.html
footprint CAP-0402 (0402 (1005M) Capacitor)
pins: 1, 2

## GCM155R71C393KA37D
designator C?  Capacitance: 39nF  (hidden comment: *)
Capacitor, Ceramic (MLCC), 39nF, ±10%, 16V, X7R, ±10%, SMD 0402; Manufacturer: Murata Electronics; Manufacturer Part Number: GCM155R71C393KA37D; Package Size: 0402; JLCPCB Basic Part: No; JLCPCB Part Number: C710663; Supplier 1: LCSC; Category: Capacitors - MLCC; Supplier Part Number 1: C710663; Tolerance: ±10%; Voltage Rating: 16V; Temperature Coefficient: X7R; RoHS: Yes; ComponentLink1Description: Datasheet; ComponentLink1URL: https://wmsc.lcsc.com/wmsc/upload/file/pdf/v2/lcsc/2201111430_Murata-Electronics-GCM155R71C393KA37D_C710663.pdf; ComponentLink2Description: JLCPCB Part URL; ComponentLink2URL: https://jlcpcb.com/partdetail/C710663; ComponentLink3Description: LCSC Part URL; ComponentLink3URL: https://lcsc.com/product-detail/Multilayer-Ceramic-Capacitors-MLCC---SMD-SMT_Murata-Electronics-Murata-Electronics-GCM155R71C393KA37D_C710663.html
footprint CAP-0402 (0402 (1005M) Capacitor)
pins: 1, 2

## GCM155R71C473KA37D
designator C?  Capacitance: 47nF  (hidden comment: *)
Capacitor, Ceramic (MLCC), 47nF, ±10%, 16V, X7R, ±10%, SMD 0402; Manufacturer: Murata Electronics; Manufacturer Part Number: GCM155R71C473KA37D; Package Size: 0402; JLCPCB Basic Part: No; JLCPCB Part Number: C126525; Supplier 1: LCSC; Category: Capacitors - MLCC; Supplier Part Number 1: C126525; Tolerance: ±10%; Voltage Rating: 16V; Temperature Coefficient: X7R; RoHS: Yes; ComponentLink1Description: Datasheet; ComponentLink1URL: https://wmsc.lcsc.com/wmsc/upload/file/pdf/v2/lcsc/1811081510_Murata-Electronics-GCM155R71C473KA37D_C126525.pdf; ComponentLink2Description: JLCPCB Part URL; ComponentLink2URL: https://jlcpcb.com/partdetail/C126525; ComponentLink3Description: LCSC Part URL; ComponentLink3URL: https://lcsc.com/product-detail/Multilayer-Ceramic-Capacitors-MLCC---SMD-SMT_Murata-Electronics-Murata-Electronics-GCM155R71C473KA37D_C126525.html
footprint CAP-0402 (0402 (1005M) Capacitor)
pins: 1, 2

## GCM155R71C683KA55D
designator C?  Capacitance: 68nF  (hidden comment: *)
Capacitor, Ceramic (MLCC), 68nF, ±10%, 16V, X7R, ±10%, SMD 0402; Manufacturer: Murata Electronics; Manufacturer Part Number: GCM155R71C683KA55D; Package Size: 0402; JLCPCB Basic Part: No; JLCPCB Part Number: C161166; Supplier 1: LCSC; Category: Capacitors - MLCC; Supplier Part Number 1: C161166; Tolerance: ±10%; Voltage Rating: 16V; Temperature Coefficient: X7R; RoHS: Yes; ComponentLink1Description: Datasheet; ComponentLink1URL: https://wmsc.lcsc.com/wmsc/upload/file/pdf/v2/lcsc/1811081550_Murata-Electronics-GCM155R71C683KA55D_C161166.pdf; ComponentLink2Description: JLCPCB Part URL; ComponentLink2URL: https://jlcpcb.com/partdetail/C161166; ComponentLink3Description: LCSC Part URL; ComponentLink3URL: https://lcsc.com/product-detail/Multilayer-Ceramic-Capacitors-MLCC---SMD-SMT_Murata-Electronics-Murata-Electronics-GCM155R71C683KA55D_C161166.html
footprint CAP-0402 (0402 (1005M) Capacitor)
pins: 1, 2

## GCM155R71E103KA37D
designator C?  Capacitance: 10nF  (hidden comment: *)
Capacitor, Ceramic (MLCC), 10nF, ±10%, 25V, X7R, ±10%, SMD 0402; Manufacturer: Murata Electronics; Manufacturer Part Number: GCM155R71E103KA37D; Package Size: 0402; JLCPCB Basic Part: No; JLCPCB Part Number: C126526; Supplier 1: LCSC; Category: Capacitors - MLCC; Supplier Part Number 1: C126526; Tolerance: ±10%; Voltage Rating: 25V; Temperature Coefficient: X7R; RoHS: Yes; ComponentLink1Description: Datasheet; ComponentLink1URL: https://wmsc.lcsc.com/wmsc/upload/file/pdf/v2/lcsc/1811081510_Murata-Electronics-GCM155R71E103KA37D_C126526.pdf; ComponentLink2Description: JLCPCB Part URL; ComponentLink2URL: https://jlcpcb.com/partdetail/C126526; ComponentLink3Description: LCSC Part URL; ComponentLink3URL: https://lcsc.com/product-detail/Multilayer-Ceramic-Capacitors-MLCC---SMD-SMT_Murata-Electronics-Murata-Electronics-GCM155R71E103KA37D_C126526.html
footprint CAP-0402 (0402 (1005M) Capacitor)
pins: 1, 2

## GCM155R71E104KE02D
designator C?  Capacitance: 100nF  (hidden comment: *)
Capacitor, Ceramic (MLCC), 100nF, ±10%, 25V, X7R, ±10%, SMD 0402; Manufacturer: Murata Electronics; Manufacturer Part Number: GCM155R71E104KE02D; Package Size: 0402; JLCPCB Basic Part: No; JLCPCB Part Number: C126527; Supplier 1: LCSC; Category: Capacitors - MLCC; Supplier Part Number 1: C126527; Tolerance: ±10%; Voltage Rating: 25V; Temperature Coefficient: X7R; RoHS: Yes; ComponentLink1Description: Datasheet; ComponentLink1URL: https://wmsc.lcsc.com/wmsc/upload/file/pdf/v2/lcsc/1811081510_Murata-Electronics-GCM155R71E104KE02D_C126527.pdf; ComponentLink2Description: JLCPCB Part URL; ComponentLink2URL: https://jlcpcb.com/partdetail/C126527; ComponentLink3Description: LCSC Part URL; ComponentLink3URL: https://lcsc.com/product-detail/Multilayer-Ceramic-Capacitors-MLCC---SMD-SMT_Murata-Electronics-Murata-Electronics-GCM155R71E104KE02D_C126527.html
footprint CAP-0402 (0402 (1005M) Capacitor)
pins: 1, 2

## GCM155R71E183KA55D
designator C?  Capacitance: 18nF  (hidden comment: *)
Capacitor, Ceramic (MLCC), 18nF, ±10%, 25V, ±10%, SMD 0402; Manufacturer: Murata Electronics; Manufacturer Part Number: GCM155R71E183KA55D; Package Size: 0402; JLCPCB Basic Part: No; JLCPCB Part Number: C913583; Supplier 1: LCSC; Category: Capacitors - MLCC; Supplier Part Number 1: C913583; Tolerance: ±10%; Voltage Rating: 25V; RoHS: Yes; ComponentLink1Description: Datasheet; ComponentLink1URL: https://wmsc.lcsc.com/wmsc/upload/file/pdf/v2/lcsc/2011151633_Murata-Electronics-GCM155R71E183KA55D_C913583.pdf; ComponentLink2Description: JLCPCB Part URL; ComponentLink2URL: https://jlcpcb.com/partdetail/C913583; ComponentLink3Description: LCSC Part URL; ComponentLink3URL: https://lcsc.com/product-detail/Multilayer-Ceramic-Capacitors-MLCC---SMD-SMT_Murata-Electronics-Murata-Electronics-GCM155R71E183KA55D_C913583.html
footprint CAP-0402 (0402 (1005M) Capacitor)
pins: 1, 2

## GCM155R71E223KA55D
designator C?  Capacitance: 22nF  (hidden comment: *)
Capacitor, Ceramic (MLCC), 22nF, ±10%, 25V, X7R, ±10%, SMD 0402; Manufacturer: Murata Electronics; Manufacturer Part Number: GCM155R71E223KA55D; Package Size: 0402; JLCPCB Basic Part: No; JLCPCB Part Number: C126528; Supplier 1: LCSC; Category: Capacitors - MLCC; Supplier Part Number 1: C126528; Tolerance: ±10%; Voltage Rating: 25V; Temperature Coefficient: X7R; RoHS: Yes; ComponentLink1Description: Datasheet; ComponentLink1URL: https://wmsc.lcsc.com/wmsc/upload/file/pdf/v2/lcsc/1811081510_Murata-Electronics-GCM155R71E223KA55D_C126528.pdf; ComponentLink2Description: JLCPCB Part URL; ComponentLink2URL: https://jlcpcb.com/partdetail/C126528; ComponentLink3Description: LCSC Part URL; ComponentLink3URL: https://lcsc.com/product-detail/Multilayer-Ceramic-Capacitors-MLCC---SMD-SMT_Murata-Electronics-Murata-Electronics-GCM155R71E223KA55D_C126528.html
footprint CAP-0402 (0402 (1005M) Capacitor)
pins: 1, 2

## GCM155R71E223KA55J
designator C?  Capacitance: 22nF  (hidden comment: *)
Capacitor, Ceramic (MLCC), 22nF, ±10%, 25V, X7R, ±10%, SMD 0402; Manufacturer: Murata Electronics; Manufacturer Part Number: GCM155R71E223KA55J; Package Size: 0402; JLCPCB Basic Part: No; JLCPCB Part Number: C437448; Supplier 1: LCSC; Category: Capacitors - MLCC; Supplier Part Number 1: C437448; Tolerance: ±10%; Voltage Rating: 25V; Temperature Coefficient: X7R; RoHS: Yes; ComponentLink1Description: Datasheet; ComponentLink1URL: https://wmsc.lcsc.com/wmsc/upload/file/pdf/v2/lcsc/2304140030_Murata-Electronics-GCM155R71E223KA55J_C437448.pdf; ComponentLink2Description: JLCPCB Part URL; ComponentLink2URL: https://jlcpcb.com/partdetail/C437448; ComponentLink3Description: LCSC Part URL; ComponentLink3URL: https://lcsc.com/product-detail/Multilayer-Ceramic-Capacitors-MLCC---SMD-SMT_Murata-Electronics-Murata-Electronics-GCM155R71E223KA55J_C437448.html
footprint CAP-0402 (0402 (1005M) Capacitor)
pins: 1, 2

## GCM155R71E333KA55D
designator C?  Capacitance: 33nF  (hidden comment: *)
Capacitor, Ceramic (MLCC), 33nF, ±10%, 25V, X7R, ±10%, SMD 0402; Manufacturer: Murata Electronics; Manufacturer Part Number: GCM155R71E333KA55D; Package Size: 0402; JLCPCB Basic Part: No; JLCPCB Part Number: C185046; Supplier 1: LCSC; Category: Capacitors - MLCC; Supplier Part Number 1: C185046; Tolerance: ±10%; Voltage Rating: 25V; Temperature Coefficient: X7R; RoHS: Yes; ComponentLink1Description: Datasheet; ComponentLink1URL: https://wmsc.lcsc.com/wmsc/upload/file/pdf/v2/lcsc/1912111437_Murata-Electronics-GCM155R71E333KA55D_C185046.pdf; ComponentLink2Description: JLCPCB Part URL; ComponentLink2URL: https://jlcpcb.com/partdetail/C185046; ComponentLink3Description: LCSC Part URL; ComponentLink3URL: https://lcsc.com/product-detail/Multilayer-Ceramic-Capacitors-MLCC---SMD-SMT_Murata-Electronics-Murata-Electronics-GCM155R71E333KA55D_C185046.html
footprint CAP-0402 (0402 (1005M) Capacitor)
pins: 1, 2